# Altium footprint library Mylib.PcbLib: 320 footprints (part 4 of 20)
Each footprint in its own frame and in the unit in brackets; x right, y up, seen from the top. Pads: shape width x height; smd on the part's side, far side on the other; paste and mask are expansions set on the pad; w line width, h text height; cw(c..) or ccw(c..) is an arc to the next point about the centre after c.
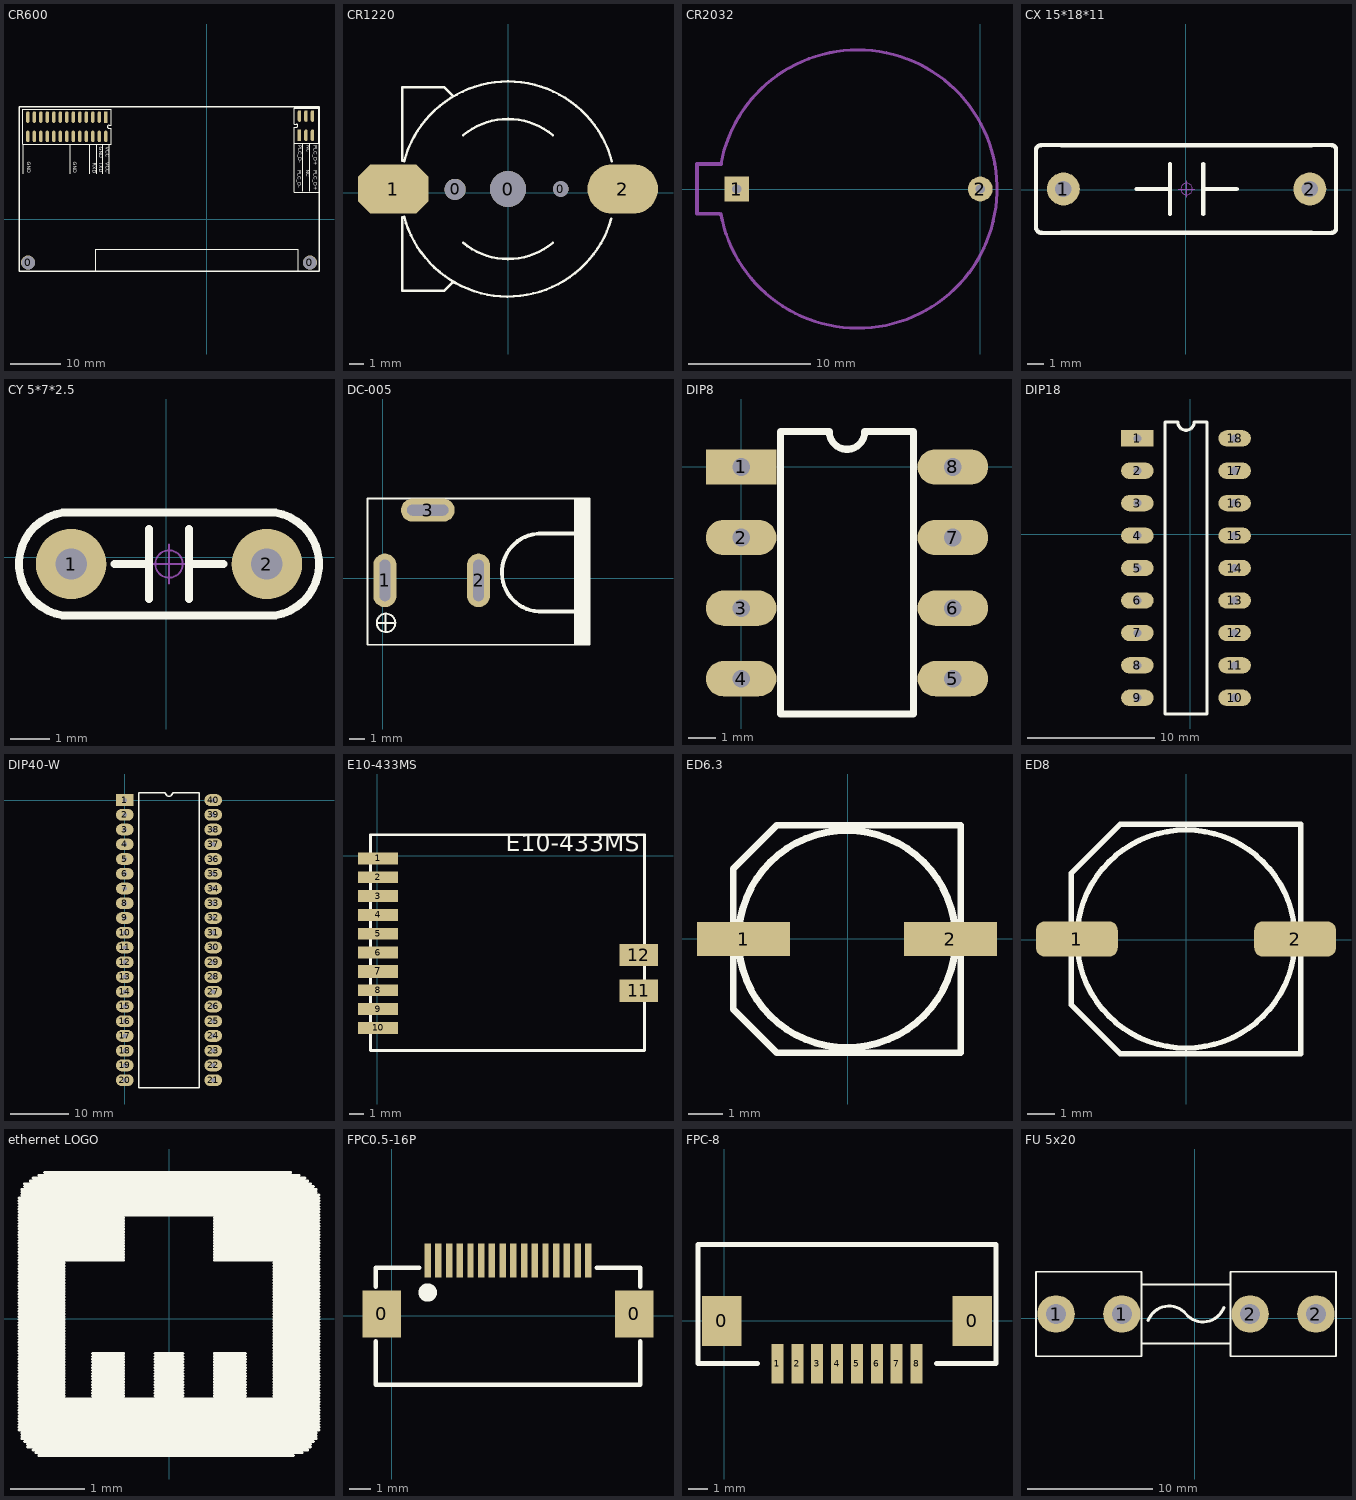
[diagram p3: the footprints below, top view; thin cyan lines are the x and y axes]

## CR600 [mm]
pads (34):
  round 2.8 hole 2.7: 0(-35.7,-8.7) 0(20.7,-8.7)
  rect 0.7x2.3 smd: 1(-20.14,20.374) 31(18.594,16.739)
  oval 0.7x2.3 smd: 2(-20.14,16.524) 3(-21.44,20.374) 4(-21.44,16.524) 5(-22.74,20.374) 6(-22.74,16.524) 7(-24.04,20.374) 8(-24.04,16.524) 9(-25.34,20.374) 10(-25.34,16.524) 11(-26.64,20.374) 12(-26.64,16.524) 13(-27.94,20.374) 14(-27.94,16.524) 15(-29.24,20.374) 16(-29.24,16.524) 17(-30.54,20.374) 18(-30.54,16.524) 19(-31.84,20.374) 20(-31.84,16.524) 21(-33.14,20.374) 22(-33.14,16.524) 23(-34.44,20.374) 24(-34.44,16.524) 25(-35.74,20.374) 26(-35.74,16.524) 32(18.594,20.589) 33(19.894,16.739) 34(19.894,20.589) 35(21.194,16.739) 36(21.194,20.589)
Top Overlay:
  lines w0.127: -36.7,9.1 -36.7,14.9 ; -27.3,9.1 -27.3,14.9 ; -23.4,9.1 -23.4,14.9 ; -22.2,-10.5 -22.2,-6 18.4,-6 18.4,-10.5 ; -22,9.1 -22,14.9 ; -20.8,9.1 -20.8,14.9 ; -19.5,9.1 -19.5,14.9 ; 17.5,15.113 17.5,5.4 22.5,5.4 ; 19.3,5.51 19.3,15.1 ; 20.7,5.51 20.7,15.1
  lines w0.2: 17.5,15.113 17.5,18.339 17.944,18.339 ccw(c17.944,18.664) 17.944,18.989 17.553,18.989 17.553,22.2 ; -36.726,14.913 -36.726,22 -19.099,22 -19.099,18.774 -19.49,18.774 ccw(c-19.49,18.449) -19.49,18.124 -19.099,18.124 -19.099,14.913 -36.726,14.913
  lines w0.203: 17.5,15.113 22.455,15.113
  lines w0.254: 17.553,22.2 22.379,22.2 ; 22.43,15.139 22.455,15.113 22.455,22.124 ; -37.5,-10.5 22.5,-10.5 22.5,22.5 -37.5,22.5 -37.5,-10.5
  text "NC" at 19.6,9.804 h1.27
  text "PLC_D-" at 18,9.8 h1.27
  text "PLC_D+" at 21.1,9.8 h1.27
  text "GND" at -36.2,11.5 h1.27
  text "GND" at -27,11.5 h1.27
  text "RXD" at -23.1,11.3 h1.27
  text "GND" at -21.8,14.404 h1.27
  text "TXD" at -21.8,11.304 h1.27
  text "VCC" at -20.5,11.304 h1.27
  text "VCC" at -20.5,14.404 h1.27
  text "PLC_D+" at 21.1,14.7 h1.27
  text "PLC_D-" at 18.1,14.7 h1.27
  text "NC" at 19.7,14.704 h1.27

## CR1220 [mm]
pads (5):
  round 1.5 hole 1.5: 0(-3.75,0.229)
  round 2.54 hole 2.54: 0(0,0.254)
  round 1.1 hole 1.1: 0(3.75,0.254)
  oct 5x3.5 smd: 1(-8.128,0.254)
  oval 5x3.5 smd: 2(8.128,0.254)
Top Overlay:
  lines w0.178: -7.5,-1.746 -7.5,-6.946 -4.5,-6.946 -3.925,-6.371 ; -7.5,2.254 -7.5,7.454 -4.5,7.454 -3.9,6.854 ; -7.363,-1.709 ccw(c0,0.254) 7.327,-1.839 ; -7.363,2.217 cw(c0,0.254) 0,7.874 cw(c0,0.254) 7.363,2.217 ; -3.175,-3.556 ccw(c0,0.254) 3.172,-3.558 ; -3.169,4.069 cw(c0,0.254) 3.172,4.066
3D body "CR1220.STEP": height 4.19, standoff -0.75, extent -9.377,-7.377 9.123,7.62

## CR2032 [mil]
pads (2):
  rect 80x80 hole 30: 1(-787.4,0)
  round 80 hole 30: 2(0,0)
Mechanical 1:
  lines w10: -838.99,-79.11 ccw(c-396,0) -838.73,80.57
  lines w12: -838.73,80.57 -916,80.57 -916,-80 -844,-80 -837.74,-85.84
3D body: height 78.74, standoff 0, extent -788.27,-390.59 -1.3,396.6

## CX 15*18*11 [mm] "安规电容"
pads (2):
  round 2 hole 1: 1(-7.449,0.051) 2(7.551,0.051)
Top Overlay:
  lines w0.25: -9.119,-2.28 -9.119,2.413 ; -8.814,2.718 -7.569,2.718 ; -8.782,-2.616 -7.569,-2.616 ; 7.671,-2.616 8.884,-2.616 ; 7.671,2.718 8.884,2.718 ; 9.144,-2.356 9.144,2.458
  lines w0.254: -9.119,-2.28 ccw(c-8.782,-2.28) -8.782,-2.616 ; -9.119,2.413 cw(c-8.814,2.413) -8.814,2.718 ; -7.569,-2.616 7.671,-2.616 ; -7.569,2.718 7.671,2.718 ; -2.997,0.051 -0.965,0.051 ; -0.965,-1.473 -0.965,1.575 ; 1.067,-1.473 1.067,1.575 ; 1.067,0.051 3.099,0.051 ; 8.884,-2.616 ccw(c8.884,-2.356) 9.144,-2.356 ; 8.884,2.718 cw(c8.884,2.458) 9.144,2.458
Mechanical 15:
  circle w0.05: c0.051,0.051 r0.35
  lines w0.05: -0.449,0.051 0.551,0.051 ; 0.051,-0.449 0.051,0.551
3D body "x2v-18w11h5t-p15.stp": height 11.01, standoff -3.99, extent -8.966,-2.464 9.034,2.541

## CY 5*7*2.5 [mm] "脚距5mm，直径7mm，厚2.5mm"
pads (2):
  round 1.8 hole 0.8: 1(-2.432,-0.174) 2(2.568,-0.174)
Top Overlay:
  lines w0.203: -1.329,-0.174 -0.44,-0.174 ; -0.44,-1.063 -0.44,0.715 ; 0.576,-1.063 0.576,0.715 ; 0.576,-0.174 1.465,-0.174 ; -2.658,1.139 ccw(c-2.432,-0.174) -2.658,-1.487 2.794,-1.487 ; -2.658,1.139 -2.658,1.139 ; -2.658,1.139 2.794,1.139 cw(c2.568,-0.174) 2.794,-1.487 ; 2.794,-1.487 2.794,-1.487
Mechanical 15:
  circle w0.05: c0.068,-0.174 r0.35
  lines w0.05: -0.432,-0.174 0.568,-0.174 ; 0.068,-0.674 0.068,0.326
3D body "CY 5X7X2.5.STEP": height 7, standoff -3.5, extent -3.432,-1.424 3.568,1.076

## DC-005 [mm]
pads (3):
  oval 1.5x3.5 hole 0.7 slot 2.7 at 90 deg: 1(0.127,-0.127) 2(6.223,-0.127)
  oval 3.5x1.5 hole 0.7 slot 2.7 at 0 deg: 3(2.921,4.445)
Top Overlay:
  circle w0.127: c0.203,-2.896 r0.604
  region: 13.462,-4.318 13.462,5.207 12.827,5.207 12.827,-4.318
  region: 13.462,-4.318 13.462,5.207 12.446,5.207 12.446,-4.318
  lines w0.127: -0.33,-2.896 0.686,-2.896 ; 0.178,-3.404 0.178,-2.388 ; -1.016,-4.318 13.462,-4.318 13.462,5.207 -1.016,5.207 -1.016,-1.524 -1.016,-4.318
  lines w0.254: 10.16,-2.159 13.183,-2.159 ; 10.16,2.921 13.208,2.921 ; 10.287,2.924 ccw(c10.287,0.381) 10.414,-2.159
3D body "SW3dPS-rapc722.STEP": height 10.92, standoff -3.56, extent -0.923,-4.267 13.674,5.258

## DIP8 [mm]
pads (8):
  rect 2.54x1.27 hole 0.635: 1(0,0)
  oval 2.54x1.27 hole 0.635: 2(0,-2.54) 3(0,-5.08) 4(0,-7.62) 5(7.62,-7.62) 6(7.62,-5.08) 7(7.62,-2.54) 8(7.62,0)
Top Overlay:
  lines w0.254: 1.422,-8.89 6.198,-8.89 6.198,1.27 4.445,1.27 cw(c3.81,1.27) 3.175,1.27 1.422,1.27 1.422,-8.89
3D body "DIP-8.STEP": height 3.8, standoff -4.58, extent 0.003,-8.765 7.823,1.145

## DIP18 [mil]
pads (18):
  rect 100x50 hole 25: 1(-163,295)
  oval 100x50 hole 25: 2(-163,195) 3(-163,95) 4(-163,-5) 5(-163,-105) 6(-163,-205) 7(-163,-305) 8(-163,-405) 9(-163,-505) 10(137,-505) 11(137,-405) 12(137,-305) 13(137,-205) 14(137,-105) 15(137,-5) 16(137,95) 17(137,195) 18(137,295)
Top Overlay:
  lines w10: -78,-555 52,-555 52,345 12,345 cw(c-13,345) -38,345 -78,345 -78,-555
3D body: height 100, standoff 0, extent -181,-545 149,320

## DIP40-W [mil]
pads (40):
  rect 120x80 hole 30: 1(0,0)
  oval 120x80 hole 30: 2(0,-100) 3(0,-200) 4(0,-300) 5(0,-400) 6(0,-500) 7(0,-600) 8(0,-700) 9(0,-800) 10(0,-900) 11(0,-1000) 12(0,-1100) 13(0,-1200) 14(0,-1300) 15(0,-1400) 16(0,-1500) 17(0,-1600) 18(0,-1700) 19(0,-1800) 20(0,-1900) 21(600,-1900) 22(600,-1800) 23(600,-1700) 24(600,-1600) 25(600,-1500) 26(600,-1400) 27(600,-1300) 28(600,-1200) 29(600,-1100) 30(600,-1000) 31(600,-900) 32(600,-800) 33(600,-700) 34(600,-600) 35(600,-500) 36(600,-400) 37(600,-300) 38(600,-200) 39(600,-100) 40(600,0)
Top Overlay:
  lines w10: 95,-1950 505,-1950 505,50 325,50 cw(c300,50) 275,50 95,50 95,-1950
3D body: height 224.41, standoff -101.57, extent -4.73,-1980.31 605.11,84.65

## E10-433MS [mm]
pads (12):
  rect 2.7x0.8 smd: 1(0.068,-0.188) 2(0.068,-1.458) 3(0.068,-2.728) 4(0.068,-3.998) 5(0.068,-5.268) 6(0.068,-6.538) 8(0.068,-9.078) 9(0.068,-10.348) 10(0.068,-11.618)
  rect 2.7x0.9 smd: 7(0.068,-7.808)
  rect 2.6x1.5 smd: 11(17.64,-9.113) 12(17.64,-6.703)
Top Overlay:
  lines w0.2: -0.452,1.367 -0.452,-13.143 18.018,-13.143 18.018,1.407 -0.452,1.407
  text "E10-433MS" at 8.675,-0.1 h2
3D body: height 1.27, standoff 0, extent 3.05,-6.1 6.65,-2.65
3D body: height 0.76, standoff 0, extent -0.45,-13.15 17.975,1.425

## ED6.3 [mm]
pads (2):
  rect 2.7x1 smd: 1(-3.015,-0.003) 2(2.985,-0.003)
Top Overlay:
  circle w0.2: c-0.015,-0.003 r3.15
  lines w0.2: -3.315,2.029 -3.315,-2.035 -2.047,-3.303 3.285,-3.303 3.285,3.297 -2.047,3.297 -3.303,2.042
3D body "SL-E.step": height 5.2, standoff 0, extent -3.515,-3.305 3.485,3.295

## ED8 [mm]
pads (2):
  rrect50% 3x1.3 smd: 1(-4.005,0.028) 2(3.995,0.028)
Top Overlay:
  circle w0.2: c-0.005,0.028 r4
  lines w0.2: -4.205,-2.385 -4.205,2.441 -2.418,4.228 4.195,4.228 4.195,-4.172 -2.418,-4.172 -4.205,-2.385
3D body "SL-H.step": height 10.5, standoff 0, extent -4.526,-4.188 4.474,4.112

## ethernet LOGO [mm]
Top Overlay:
  drawing of 213 lines, arcs and shapes, not listed

## FPC0.5-16P [mm]
pads (18):
  rect 1.8x2.2 smd: 0(-0.47,0.08) 0(11.33,0.08)
  rect 0.3x1.6 smd: 1(1.68,2.577) 2(2.18,2.577) 3(2.68,2.577) 4(3.18,2.577) 5(3.68,2.577) 6(4.18,2.577) 7(4.68,2.577) 8(5.18,2.577) 9(5.68,2.577) 10(6.18,2.577) 11(6.68,2.577) 12(7.18,2.577) 13(7.68,2.577) 14(8.18,2.577) 15(8.68,2.577) 16(9.18,2.577)
Top Overlay:
  circle w0.5: c1.68,1.08 r0.18
  lines w0.2: -0.745,-1.19 -0.745,-3.222 11.605,-3.222 11.605,-1.19 ; -0.745,1.35 -0.745,2.239 1.287,2.239 ; 9.573,2.239 11.605,2.239 11.605,1.35
3D body "FPC0.5-16P.STEP": height 2, standoff -0.01, extent -0.67,-3.151 11.53,2.849

## FPC-8 [mm]
pads (10):
  rect 2x2.5 smd: 0(-0.133,-0.009) 0(12.467,-0.009)
  rect 0.6x2 smd: 1(2.667,-2.159) 2(3.667,-2.159) 3(4.667,-2.159) 4(5.667,-2.159) 5(6.667,-2.159) 6(7.667,-2.159) 7(8.667,-2.159) 8(9.667,-2.159)
Top Overlay:
  lines w0.254: 1.667,-2.159 -1.333,-2.159 -1.333,3.841 13.667,3.841 13.667,-2.159 10.667,-2.159

## FU 5x20 [mm] "5*20保险管底座夹子"
pads (4):
  round 3 hole 1.6: 1(-11.086,0.33) 1(-5.816,0.33) 2(4.444,0.33) 2(9.714,0.33)
Top Overlay:
  lines w0.15: -4.242,-2.02 2.87,-2.02 ; -4.242,2.68 2.87,2.68 ; -12.686,-3.05 -12.686,3.71 -4.242,3.71 -4.242,-3.05 -12.686,-3.05 ; 2.87,-3.05 2.87,3.71 11.314,3.71 11.314,-3.05 2.87,-3.05
  lines w0.254: -3.713,-0.19 cw(c-2.048,-0.813) -0.686,0.33 ccw(c0.676,1.473) 2.341,0.85
3D body "FU 5x20.STEP": height 9.77, standoff -3.6, extent -11.486,-2.82 10.114,3.48